# Altium footprint library 插接件.PcbLib: 1 footprints
Each footprint in its own frame and in the unit in brackets; x right, y up, seen from the top. Pads: shape width x height; smd on the part's side, far side on the other; paste and mask are expansions set on the pad; w line width, h text height; cw(c..) or ccw(c..) is an arc to the next point about the centre after c.
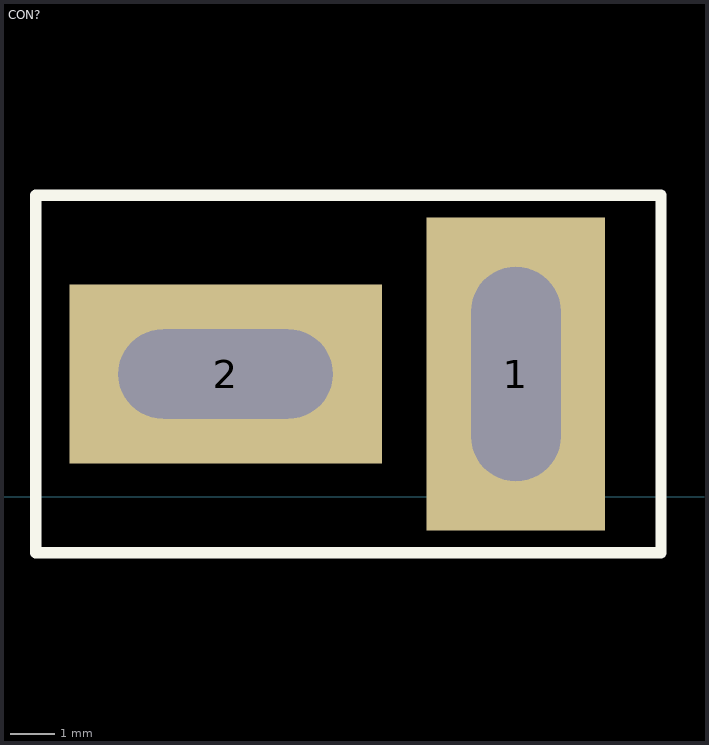
[diagram p0: the footprint, top view; thin cyan lines are the x and y axes]

## CON? [mm] "CON?"
height 18.999
pads (2):
  rect 4x7 hole 2 slot 4.8 at 90 deg: 1(-8,2.75)
  rect 7x4 hole 2 slot 4.8 at 0 deg: 2(-14.5,2.75)
Top Overlay:
  lines w0.254: -18.75,-1.25 -4.75,-1.25 -4.75,6.75 -18.75,6.75 -18.75,-1.25